# Altium schematic symbol library LimeMicroAltiumLib_schLib_r05.SchLib: 582 symbols (part 10 of 13) (continued)
## MOLEX_CONNECTOR_0878321420
designator J?, comment 878321420
Male Header, Pitch 2 mm, 2 x 7 Position, Height 7.6 mm, -55 to 105 degC, RoHS; Part Description: Connector Header Surface Mount 14 position 0.079" (2.00mm); Manufacturer: Molex; Manufacturer Part Number 1: 87832-1420; Number of Positions: 14; Current Rating: 2A; Insulation Resistance: 1GR; Voltage Rating: 125V; Shrouded: Yes (With); Pitch: 2mm; Glow Wire Compliant: Non-compliant; Supplier 1: Digi-Key; Stock 1: 62479; Pricing 1: 1 = 1,83000, 10 = 1,66000, 100 = 1,42280, 500 = 1,18562, 3200 = 0,94850, 6400 = 0,90108 (USD); RoHS: Yes; Mount: Surface Mount; Color: Black; Housing Color: Black; Housing Material: Thermoplastic; Contact Plating: Gold; Contact Material: Brass; Min Operating Temperature: -55°C; Max Operating Temperature: 105°C; Number of Rows: 2; Packaging: Rail/Tube; Termination: SMD/SMT; Number of Contacts: 14; Orientation: Vertical; Gender: Male; Package Quantity: 3200; Number of Circuits: 14; Voltage Rating (DC): 125V; Radiation Hardening: No; REACH SVHC: No SVHC; Lead Free: Lead Free; Flammability Rating: UL94 V-0; ComponentLink1URL: https://datasheet.ciiva.com/5151/0878321420-pcb-headers-176595-5151942.pdf?src-supplier=Mouser; ComponentLink1Description: https://datasheet.ciiva.com/5151/0878321420-pcb-headers-176595-5151942.pdf?src-supplier=Mouser; ComponentLink2URL: https://datasheet.ciiva.com/30118/0878321420-pcb-headers-30118102.pdf?src-supplier=Onlinecomponents.com; ComponentLink2Description: https://datasheet.ciiva.com/30118/0878321420-pcb-headers-30118102.pdf?src-supplier=Onlinecomponents.com; ComponentLink3URL: https://datasheet.ciiva.com/11746/0900766b80d68d6a-11746394.pdf?src-supplier=RSComponents; ComponentLink3Description: https://datasheet.ciiva.com/11746/0900766b80d68d6a-11746394.pdf?src-supplier=RSComponents; ComponentLink4URL: https://datasheet.ciiva.com/7814/1625645-7814923.pdf?src-supplier=Element14; ComponentLink4Description: https://datasheet.ciiva.com/7814/1625645-7814923.pdf?src-supplier=Element14; ComponentLink5URL: https://datasheet.ciiva.com/27055/1934622-27055085.pdf?src-supplier=Jameco; ComponentLink5Description: https://datasheet.ciiva.com/27055/1934622-27055085.pdf?src-supplier=Jameco; ComponentLink6URL: https://datasheet.ciiva.com/1103/1739253-1103569.pdf?src-supplier=Element14; ComponentLink6Description: https://datasheet.ciiva.com/1103/1739253-1103569.pdf?src-supplier=Element14; ComponentLink7URL: https://datasheet.ciiva.com/18453/70090647-18453733.pdf?src-supplier=Allied+Electronics; ComponentLink7Description: https://datasheet.ciiva.com/18453/70090647-18453733.pdf?src-supplier=Allied+Electronics; ComponentLink8URL: https://datasheet.ciiva.com/6168/1597333-6168907.pdf?src-supplier=Farnell; ComponentLink8Description: https://datasheet.ciiva.com/6168/1597333-6168907.pdf?src-supplier=Farnell; Supplier Part Number 1: WM18641-ND
footprint MOLX-878321420_V (SMD, 14-Leads, Body 16.65x6.3mm, Pitch 2mm)
pins: 1, 2, 3, 4, 5, 6, 7, 8, 9, 10, 11, 12, 13, 14

## MURA120T3G_diode
designator D?, comment MURA120T3G
Part Description: Diode Standard 200V 2A Surface Mount SMA; Manufacturer: ON Semiconductor; Max Surge Current: 40A; Forward Voltage: 875mV; Forward Current: 2A; Peak Reverse Current: 2uA; Recovery Time: 35ns; Max Repetitive Reverse Voltage (Vrrm): 200V; Element Configuration: Single; Polarity: Standard; Output Current: 1A; ComponentLink1URL: http://www.mouser.com/ds/2/427/mmsz5225-102133.pdf; ComponentLink1Description: http://www.mouser.com/ds/2/427/mmsz5225-102133.pdf; ComponentLink2URL: http://www.onsemi.com/pub/Collateral/MMSD4148T1-D.PDF; ComponentLink2Description: http://www.onsemi.com/pub/Collateral/MMSD4148T1-D.PDF; ComponentLink3URL: http://www.farnell.com/datasheets/1707241.pdf; ComponentLink3Description: http://www.farnell.com/datasheets/1707241.pdf; ComponentLink4URL: https://www.verical.com/server-webapp/html/getDatasheet?partID=78734; ComponentLink4Description: https://www.verical.com/server-webapp/html/getDatasheet?partID=78734; Supplier 1: Digi-Key; Manufacturer Part Number 1: MURA120T3G; RoHS: Yes; Stock 1: 48194; Pricing 1: 1 = 0,39000, 10 = 0,31900, 100 = 0,21720, 500 = 0,16288, 1000 = 0,12217 (USD); Case/Package: SMA; Number of Pins: 2; Contact Plating: Matte,Tin; Min Operating Temperature: -65°C; Max Operating Temperature: 175°C; Package Quantity: 1; Packaging: Tape and Reel; Average Rectified Current: 2A; Reverse Recovery Time: 35ns; Peak Non-Repetitive Surge Current: 40A; Max Forward Surge Current (Ifsm): 40A; Voltage Rating (DC): 200V; Current Rating: 2A; Max Reverse Voltage (DC): 200V; Reverse Voltage: 200V; Length: 4.57mm; Height: 2.05mm; Width: 2.92mm; Radiation Hardening: No; REACH SVHC: No SVHC; Lead Free: Lead Free; Halogen Free: Halogen Free; ComponentLink5URL: http://www.onsemi.com/pub/Collateral/MURA115T3-D.PDF; ComponentLink5Description: http://www.onsemi.com/pub/Collateral/MURA115T3-D.PDF; ComponentLink6URL: http://www.jameco.com/Jameco/Products/ProdDS/1100812.pdf; ComponentLink6Description: http://www.jameco.com/Jameco/Products/ProdDS/1100812.pdf; ComponentLink7URL: http://uk.rs-online.com/webdocs/1221/0900766b812212fb.pdf; ComponentLink7Description: http://uk.rs-online.com/webdocs/1221/0900766b812212fb.pdf; ComponentLink8URL: http://www.farnell.com/datasheets/1750742.pdf; ComponentLink8Description: http://www.farnell.com/datasheets/1750742.pdf; Supplier Part Number 1: MURA120T3GOSCT-ND
footprint MURA120T3G_diode_DO-214AC
pins: A, C

## MUX-74HC4067
designator IC?, comment 74HC4067
MUX-74HC4067; Manufacturer Part Number 1: 74HC4067PW,118; Manufacturer: NXP Semiconductors; Function: Multiplexer/Demultiplexer; On-State Resistance: 120 Ohm; Circuit: 1 x 1:16; Current - Supply: 16µA; Voltage - Supply, Single/Dual (±): 2 V ~ 10 V; Voltage Supply Source: Single Supply; Supplier 1: Digi-Key; Mounting Type: Surface Mount; Supplier Device Package: 24-TSSOP; Packaging: Tape & Reel (TR); RoHS: RoHS Compliant; Operating Temperature: -40°C ~ 125°C; Category: Integrated Circuits (ICs); Package / Case: 24-TSSOP (0.173", 4.40mm Width); Supplier Part Number 1: 74HC4067PW,118-ND
footprint SSOP-24 (SOP, 24-Leads, Body 8,5x5,6mm (max), Pitch 0,65mm, IPC Medium Density)
footprint SSOP-24 (SOP, 24-Leads, Body 8,5x5,6mm (max), Pitch 0,65mm, IPC Medium Density)
pins: 1 COM (io), 2 I7 (io), 3 I6 (io), 4 I5 (io), 5 I4 (io), 6 I3 (io), 7 I2 (io), 8 I1 (io), 9 I0 (io), 10 S0 (in), 11 S1 (in), 12 GND (power), 13 S3 (in), 14 S2 (in), 15 ~{EN} (in), 16 I15 (io), 17 I14 (io), 18 I13 (io), 19 I12 (io), 20 I11 (io), 21 I10 (io), 22 I9 (io), 23 I8 (io), 24 VCC (power)

## MX25U1635EM1I-10G
designator IC?, comment MX25U1635EM1I
Manufacturer: Macronix; Manufacturer Part Number: MX25U1635EM1I-10G; Part Description: FLASH - NOR Memory IC 16Mb (2M x 8) SPI 104MHz 8-SOP; Memory Type: Non-Volatile; Memory Format: FLASH; Memory Size: 16Mb (2M x 8); Write Cycle Time - Word, Page: 30µs, 3ms; Memory Interface: SPI; Voltage - Supply: 1.65 V ~ 2 V; Supplier 1: Digi-Key; RoHS: RoHS Compliant; Category: Integrated Circuits (ICs); Stock 1: 29792; Pricing 1: 1=1.27, 500=0.98924 (USD); Packaging: Tube; Part Status: Not For New Designs; Technology: FLASH - NOR; Operating Temperature: -40°C ~ 85°C (TA); Mounting Type: Surface Mount; Package / Case: 8-SOIC (0.154", 3.90mm Width); Supplier Device Package: 8-SOP; ComponentLink1URL: http://www.macronix.com/Lists/Datasheet/Attachments/6247/MX25U1635E,%201.8V,%2016Mb,%20v2.1.pdf; ComponentLink1Description: http://www.macronix.com/Lists/Datasheet/Attachments/6247/MX25U1635E,%201.8V,%2016Mb,%20v2.1.pdf; Supplier Part Number 1: 1092-1123-ND
footprint MX25U1635EM1I-10G_SOP8_150mil (8-Pin Small Outline Integrated Circuit 1.27 mm Pitch)
pins: 1 CS# (in), 2 SO/SIO1 (io), 3 WP#/SIO2 (io), 4 GND, 5 SI/SIO0 (io), 6 SCLK (in), 7 NC/SIO3 (io), 8 VCC

## N25Q016A11E5140F
designator IC?
Manufacturer: Micron Technology Inc.; Manufacturer Part Number 1: N25Q016A11E5140F TR; Part Description: IC FLASH 16MBIT 108MHZ LBGA; Voltage - Supply: 1.7 V ~ 2 V; Speed: 108MHz; Interface: SPI Serial; Memory Size: 16M (4M x 4); Memory Type: FLASH - NOR; Format - Memory: FLASH; Supplier 1: Digi-Key; Supplier Device Package: 8-XFCSP (2x2.8); RoHS: RoHS Compliant; Packaging: Cut Tape (CT); Package / Case: 8-XFBGA, CSPBGA; Operating Temperature: -40°C ~ 85°C (TA); Category: Integrated Circuits (ICs); Supplier Part Number 1: 557-1634-1-ND
footprint N25Q016A11E5140F (2.8 x 2 16 MB memory)
pins: A1 VCC (power), A2 #S (in), B1 HOLD#/DQ3 (in), B2 DQ1 (io), C1 C (in), C2 W#/VPP/DQ2 (io), D1 DQ0 (io), D2 VSS

## NA6223-AL_Flyback_transformer
designator T?, comment Flyback transformer NA6223-AL
Part Description: Audio Transformers / Signal Transformers NA6223 10W 0.33Ohms For TPS23753A; Manufacturer: Coilcraft; Manufacturer Part Number 1: NA6223-ALD; Current Rating: 2A; Supplier 1: Mouser; RoHS: No; Stock 1: 2080; Pricing 1: 1 = 4,20000, 10 = 3,78000, 50 = 3,36000, 100 = 3,20000, 1000 = 2,49000, 10000 = 2,49000 (USD); REACH SVHC: Unknown; Supplier Part Number 1: 994-NA6223-ALD
footprint PoE13P-50L_Flyback_transformer
pins: 1, 2, 3, 4, 5, 6, 7, 10
text: Pri; W1B; Sync; W5; W1A; Sec; W3; Bias

## NANO_SIM_SIM8060-6-1-14-00-A
designator J?, comment Nano SIM card holder
Part Description: 8 (6 + 2) Position Card Connector NANO SIM Surface Mount, Right Angle Gold; Manufacturer: Global Connector Technology; Manufacturer Part Number 1: SIM8060-6-1-14-00-A; Supplier 1: Newark; Supplier Part Number 1: 94AC8253; Stock 1: 553; Pricing 1: 1=1,22000, 10=1,17000, 25=1,10000, 50=1,05000, 100=0,98900, 250=0,93200, 500=0,87400 (USD); RoHS: No
footprint NANO_SIM_SIM8060-6-1-14-00-A
pins: C1 VCC (power), C2 RST (in), C3 CLK (in), C5 GND (power), C6 VPP, C7 I/O (io), S1 SHIELD_GND (power), S2 SHIELD_GND (power), S3 SHIELD_GND (power), SW CD

## nano_SIM_SIM8066-6-1-14-01-A
designator J?, comment nano SIM (push-push)
Part Description: 7 (6 + 1) Position Card Connector NANO SIM Surface Mount, Right Angle Gold; Manufacturer: Global Connector Technology; Manufacturer Part Number 1: SIM8066-6-1-14-01-A; Supplier 1: Farnell; Supplier Part Number 1: 3772948; Stock 1: 1500; Pricing 1: 1500=1,00000, 7500=0,93000, 15000=0,86600, 30000=0,81900 (EUR); RoHS: No
footprint nano_SIM_SIM8066-6-1-14-01-A
pins: C1 VCC (power), C2 RST (in), C3 CLK (in), C5 GND (power), C6 VPP (power), C7 I/O (io), CD (io), G1 GND (power), G2 GND (power), G3 GND (power), G4 GND (power)

## NB3H83905C
designator IC?
Manufacturer: ON Semiconductor; Manufacturer Part Number 1: NB3H83905CMNG; Part Description: Clock Fanout Buffer (Distribution) IC 100MHz 20-VFQFN Exposed Pad; Output: LVCMOS, LVTTL; Voltage - Supply: 1.6 V ~ 3.465 V; Input: LVCMOS, LVTTL, Crystal; Ratio - Input:Output: 1:6; Number of Circuits: 1; Frequency - Max: 100MHz; Differential - Input:Output: No/No; Supplier 1: Digi-Key; Packaging: Tape & Reel (TR); Operating Temperature: -40°C ~ 85°C; Type: Fanout Buffer (Distribution); Mounting Type: Surface Mount; Category: Integrated Circuits (ICs); RoHS: RoHS Compliant; Package / Case: 20-VFQFN Exposed Pad; Supplier Device Package: 20-QFN (3x4); Supplier Part Number 1: NB3H83905CMNGOS-ND
footprint NB3H83905C_20QFN (QFN, 20-Leads, Body 4,00x4,00mm, Pitch 0,50mm, Thermal Pad 2,70x2,70mm, IPC Medium Density)
pins: 1 GND, 2 GND, 3 BCLK0 (out), 4 VDDO (power), 5 BCLK1 (out), 6 GND, 7 GND, 8 BCLK2 (out), 9 VDD (power), 10 BCLK3 (out), 11 GND, 12 GND, 13 BCLK4 (out), 14 VDDO (power), 15 BCLK5 (out), 16 NC, 17 ENABLE1 (in), 18 XTAL_IN/CLK (in), 19 XTAL_OUT (out), 20 ENABLE2 (in), 21 EP

## NC7SV74K8XCT
designator IC?
Manufacturer: Fairchild Semiconductor; Max Propagation Delay @ V, Max CL: 2.8ns @ 3.3V, 30pF; Frequency - Clock: 200MHz; Current - Output High, Low: 24mA, 24mA; Current - Quiescent: 0.9µA; Number of Bits per Element: 1; Trigger Type: Positive Edge; Output Type: Differential; Function: Set(Preset) and Reset; Input Capacitance: 2pF; Voltage - Supply: 0.9 V ~ 3.6 V; Supplier 1: Digi-Key; Operating Temperature: -40°C ~ 85°C (TA); Mounting Type: Surface Mount; Package / Case: 8-VFSOP (0.091", 2.30mm Width); Packaging: Cut Tape (CT); Number of Elements: 1; Manufacturer Part Number 1: NC7SV74K8X; RoHS: RoHS Compliant; Type: D-Type; Category: Integrated Circuits (ICs); Supplier Part Number 1: NC7SV74K8XCT-ND
footprint NC7SV74K8XCT (SOIC, 8-Leads, Body 2,00x2,30mm, Pitch 1,27mm, IPC Medium Density)
pins: 1 C, 2 D, 3 Qn, 4 GND, 5 Qp, 6 CLR, 7 PR, 8 VCC

## NC7WZ16P6X_DUAL_BUFFER
designator IC?, comment NC7WZ16P6X
Manufacturer: ON Semiconductor / Fairchild; Part Description: Buffer, Non-Inverting 2 Element 1 Bit per Element Push-Pull Output SC-70-6; Min Supply Voltage: 1.65V; Max Supply Voltage: 5.5V; Number of Channels: 2; Propagation Delay: 3.8ns; Logic Function: Buffer,Inverting; Max Power Dissipation: 180mW; Low Level Output Current: 32mA; Polarity: Non-Inverting; Number of Bits per Element: 1; High Level Output Current: -32mA; Turn-On Delay Time: 10.6ns; Quiescent Current: 1uA; Supplier 1: Digi-Key; Manufacturer Part Number 1: NC7WZ16P6X; Stock 1: 0; Mount: Surface Mount; Case/Package: SC; Number of Pins: 6; Weight: 0.028g; Contact Plating: Matte,Tin; Min Operating Temperature: -40°C; Max Operating Temperature: 125°C; Number of Inputs: 2; Number of Outputs: 2; Packaging: Tape and Reel; Package Quantity: 3000; Number of Elements: 2; Number of Input Lines: 2; Number of Output Lines: 2; Termination: SMD/SMT; Number of Circuits: 2; Number of Bits: 2; Length: 2mm; Height: 1mm; Width: 1.25mm; Radiation Hardening: No; REACH SVHC: No SVHC; Lead Free: Lead Free; Supplier Part Number 1: NC7WZ16P6XDKR-ND
footprint SC-70_NC7WZ16P6X (SC-70 (SOT323), 6 pin)
pins: 1 A1 (in), 2 GND, 3 A2 (in), 4 Y2 (out), 5 VCC (power), 6 Y1 (out)

## NCP331SNT1G
designator IC?
Manufacturer: ON Semiconductor; Part Description: IC LOAD SWITCH SOFT START 6TSOP; Switch Type: General Purpose; Number of Outputs: 1; Ratio - Input:Output: 1:1; Output Configuration: High Side; Output Type: N-Channel; Interface: On/Off; Voltage - Load: 1.8 V ~ 5.5 V; Voltage - Supply (Vcc/Vdd): Not Required; Current - Output (Max): 2A; Rds On (Typ): 33 mOhm; Supplier 1: Digi-Key; Manufacturer Part Number: NCP331SNT1G; RoHS: RoHS Compliant; Category: Integrated Circuits (ICs); Stock 1: 3079; Pricing 1: 1=0.73, 10=0.646, 100=0.4951, 500=0.3914, 1000=0.31312 (USD); Packaging: Cut Tape (CT); Part Status: Active; Input Type: -; Features: Load Discharge, Slew Rate Controlled; Fault Protection: -; Operating Temperature: -40°C ~ 85°C (TA); Package / Case: SOT-23-6 Thin, TSOT-23-6; Supplier Device Package: 6-TSOP; ComponentLink1URL: http://www.onsemi.com/pub/Collateral/NCP331-D.PDF; ComponentLink1Description: http://www.onsemi.com/pub/Collateral/NCP331-D.PDF; Supplier Part Number 1: NCP331SNT1GOSCT-ND
footprint NCP331SNT1G_SOT23-6
pins: 1 OUT (out), 2 OUT (out), 3 GND, 4 EN (in), 5 IN (in), 6 IN (in)

## NCP349
designator IC?
Manufacturer: ON Semiconductor; Manufacturer Part Number 1: NCP349MNAETBG; Current - Supply: 70µA; Voltage - Supply: 1.2 V ~ 28 V; Supplier 1: Digi-Key; Operating Temperature: -40°C ~ 85°C; Package / Case: 6-VFDFN Exposed Pad; RoHS: RoHS Compliant; Supplier Device Package: 6-DFN (2x1.6); Category: Integrated Circuits (ICs); Mounting Type: Surface Mount; Voltage - Input: -; Applications: Overvoltage Protection Controller; Packaging: Digi-Reel®; Supplier Part Number 1: NCP349MNAETBGOSDKR-ND
footprint NCP349 (SON, 6-Leads, Body 1,60x2,00mm, Pitch 0,50mm, Thermal Pad 1,20x0,79mm, IPC Medium Density)
pins: 1 IN, 2 GND, 3 FLAG, 4 OUT, 5 OUT, 6 ~{EN}, 7 IN

## NCP361SNT1G
designator IC?
Manufacturer: ON Semiconductor; Part Description: IC USB POS OVP/OCP 5TSOP; Supplier 1: Digi-Key; Manufacturer Part Number 1: NCP361SNT1G; RoHS: RoHS Compliant; Category: Circuit Protection; Stock 1: 11078; Pricing 1: 1=0.76, 10=0.673, 100=0.516, 500=0.40788, 1000=0.3263 (USD); Packaging: Cut Tape (CT); Part Status: Active; Voltage - Clamping: -; Technology: Mixed Technology; Applications: General Purpose; Mounting Type: Surface Mount; Package / Case: SOT-23-5 Thin, TSOT-23-5; Supplier Device Package: 5-TSOP; ComponentLink1URL: http://www.onsemi.com/pub/Collateral/NCP361-D.PDF; ComponentLink1Description: http://www.onsemi.com/pub/Collateral/NCP361-D.PDF; Supplier Part Number 1: NCP361SNT1GOSCT-ND
footprint NCP361SNT1G_TSOP5
pins: 1 IN (in), 2 GND, 3 ~{EN} (in), 4 ~{FLAG} (out), 5 OUT (out)

## NCP380HSN05AAT1G
designator IC?
Manufacturer: ON Semiconductor; Voltage - Input: 2.5 V ~ 5.5 V; Function: Current Limiting; Current - Output: 500mA; Supplier 1: Digi-Key; Category: Integrated Circuits (ICs); Package / Case: 6-TSOP (0.059", 1.50mm Width) 5 leads; Supplier Part Number 1: NCP380HSN05AAT1GOSCT-ND
footprint SOT23-5
pins: 1 OUT, 2 GND, 3 flag, 4 EN, 5 IN

## NCP431AVSNT1GOSCT_VREF
designator D?, comment NCP431AVSNT1G
Part Description: Shunt Voltage Reference IC Adjustable 2.5V 36 VV ±1% 100 mA SOT-23-3 (TO-236); Manufacturer: ON Semiconductor; Max Input Voltage: 2.525V; Max Output Current: 100mA; Output Voltage: 36V; Min Input Voltage: 2.475V; Tolerance: 1%; Min Output Voltage: 2.5V; Temperature Coefficient: 50ppm/°C; Cathode Current: 60uA; Reference Type: Shunt,Adjustable,Programmable; Output Type: Adjustable; Supplier 1: Digi-Key; Supplier Part Number 1: NCP431AVSNT1GOSCT-ND; Manufacturer Part Number 1: NCP431AVSNT1G; Stock 1: 4600; Pricing 1: 1=0,44000, 10=0,35700, 25=0,32640, 100=0,24290, 250=0,22008, 500=0,18216, 1000=0,13661 (USD); RoHS: Yes; Case/Package: SOT-23-3; Number of Pins: 3; Min Operating Temperature: -40°C; Max Operating Temperature: 125°C; Package Quantity: 3000; Packaging: Tape and Reel; Max Output Voltage: 36V; Output Current: 100mA; Reference Voltage: 2.5V; Length: 3.04mm; Width: 1.4mm; Height: 1.01mm; Radiation Hardening: No; REACH SVHC: No SVHC; Lead Free: Lead Free; Halogen Free: Halogen Free; ComponentLink1URL: https://datasheet.ciiva.com/8132/ncp431-d-8132432.pdf?src-supplier=Avnet; ComponentLink1Description: https://datasheet.ciiva.com/8132/ncp431-d-8132432.pdf?src-supplier=Avnet; ComponentLink2URL: https://datasheet.ciiva.com/30476/0900766b8121bbe3-30476322.pdf?src-supplier=RSComponents; ComponentLink2Description: https://datasheet.ciiva.com/30476/0900766b8121bbe3-30476322.pdf?src-supplier=RSComponents; ComponentLink3URL: https://datasheet.ciiva.com/49020/70300496-49020892.pdf?src-supplier=Allied+Electronics; ComponentLink3Description: https://datasheet.ciiva.com/49020/70300496-49020892.pdf?src-supplier=Allied+Electronics
footprint SOT23-6
pins: 1 NC, 2 NC, 3 Cathode, 4 Reference, 5 NC, 6 Anode

## NCP702SN28T1G
designator IC?
Manufacturer: ON Semiconductor; Part Description: Linear Voltage Regulator IC Positive Fixed 1 Output 2.8V 200mA 5-TSOP; Output Configuration: Positive; Output Type: Fixed; Voltage - Input (Max): 5.5V; Voltage - Output (Min/Fixed): 2.8V; Current - Output: 200mA; Control Features: Enable; Protection Features: Over Current, Over Temperature, Soft Start, Under Voltage Lockout (UVLO); Supplier 1: Digi-Key; Manufacturer Part Number 1: NCP702SN28T1G; RoHS: RoHS Compliant; Category: Integrated Circuits (ICs); Stock 1: 5251; Pricing 1: 1=0.8, 10=0.707, 100=0.542, 500=0.42848, 1000=0.34278 (USD); Packaging: Cut Tape (CT); Part Status: Active; Voltage - Output (Max): -; Voltage Dropout (Max): -; PSRR: -; Operating Temperature: -40°C ~ 125°C; Mounting Type: Surface Mount; Package / Case: SOT-23-5 Thin, TSOT-23-5; Supplier Device Package: 5-TSOP; Base Part Number: NCP702; ComponentLink1URL: http://www.onsemi.com/pub/Collateral/NCP702-D.PDF; ComponentLink1Description: http://www.onsemi.com/pub/Collateral/NCP702-D.PDF; Supplier Part Number 1: NCP702SN28T1GOSCT-ND
footprint NCP702SN28T1GOSCT-ND_SOT23-5
pins: 1 IN (in), 2 GND, 3 EN (in), 4 NC, 5 OUT (out)

## NCP1083_PoE_controller
designator IC?, comment NCP1083_PoE
Manufacturer: ON Semiconductor; Manufacturer Part Number 1: NCP1083DER2G; Pert Description: Power Over Ethernet Controller 1 Channel 802.3at (PoE+), 802.3af (PoE) 20-TSSOP-EP; Nominal Supply Current: 1.1A; Frequency: 500kHz; Output Voltage: 9V; Number of Outputs: 1; Max Duty Cycle: 80%; Max Power Dissipation: 40W; Topology: Flyback; Supplier 1: Digi-Key; Supplier Part Number 1: NCP1083DER2GOSCT-ND; Stock 1: 12659; Pricing 1: 1=4,10000, 10=3,68200, 25=3,48120, 100=3,01700, 250=2,86228, 500=2,56832, 1000=2,16605 (USD); RoHS: Yes; Case/Package: TSSOP; Number of Pins: 20; Min Operating Temperature: -40°C; Max Operating Temperature: 85°C; Switching Frequency: 500kHz; Output Current: 1.1A; Package Quantity: 2500; Packaging: Tape and Reel; Number of Channels: 1; Series: -; Supply Current: 1.1A; Radiation Hardening: No; REACH SVHC: No SVHC; Lead Free: Lead Free; Halogen Free: Halogen Free; RoHS Compliant: Yes; ComponentLink1URL: https://datasheet.ciiva.com/9213/ncp1083-d-9213696.pdf?src-supplier=Avnet; ComponentLink1Description: https://datasheet.ciiva.com/9213/ncp1083-d-9213696.pdf?src-supplier=Avnet; ComponentLink2URL: https://datasheet.ciiva.com/1573/1441870-1573173.pdf?src-supplier=Farnell; ComponentLink2Description: https://datasheet.ciiva.com/1573/1441870-1573173.pdf?src-supplier=Farnell; ComponentLink3URL: https://datasheet.ciiva.com/1647/1441870-1647157.pdf?src-supplier=Newark; ComponentLink3Description: https://datasheet.ciiva.com/1647/1441870-1647157.pdf?src-supplier=Newark; ComponentLink4URL: https://datasheet.ciiva.com/1573/1441870-1573174.pdf?src-supplier=Farnell; ComponentLink4Description: https://datasheet.ciiva.com/1573/1441870-1573174.pdf?src-supplier=Farnell; ComponentLink5URL: https://datasheet.ciiva.com/16469/ncp1083-d-16469798.pdf?src-supplier=Future+Electronics; ComponentLink5Description: https://datasheet.ciiva.com/16469/ncp1083-d-16469798.pdf?src-supplier=Future+Electronics; ComponentLink6URL: https://datasheet.ciiva.com/1512/1441870-1512909.pdf?src-supplier=Element14; ComponentLink6Description: https://datasheet.ciiva.com/1512/1441870-1512909.pdf?src-supplier=Element14
footprint NCP1083_PoE_controller_TSSOP20
pins: 1 VPORTP (power), 2 CLASS (in), 3 UVLO (in), 4 INRUSH (in), 5 ILIM1 (in), 6 VPORTN1 (power), 7 RTN (power), 8 VPORTN2 (power), 9 AUX (in), 10 TEST (in), 11 OSC (in), 12 CS (in), 13 NCLASS_AT (out), 14 ARTN (power), 15 GATE (out), 16 VDDH (power), 17 VDDL (power), 18 COMP (io), 19 FB (in), 20 SS (in), PAD EP (power)

## NCP59150
designator IC?
Manufacturer Part Number 1: NCP59151DS50R4G; Manufacturer: ON SEMICONDUCTOR; Input Voltage Min: 2.24; Dropout Voltage Vdo: 300; Output Voltage Nom.: 5; Input Voltage Max: 13.5; Output Current: 1.5; LDO Regulator Case Style: TO-263; Supplier 1: Farnell; Operating Temperature Range: -40°C to +125; Supplier Part Number 1: 2217055
footprint DPAK170P1420X450-6N (D2-PAK, 6-Pads, Body 7,75x8,46mm (max), IPC Medium Density)
pins: 1 EN, 2 IN, 3 GND, 4 OUT, 5 ADJ, DAP

## NCP59151
designator IC?
Manufacturer Part Number 1: NCP59151DS50R4G; Manufacturer: ON Semiconductor; Voltage - Output: 5V; Voltage - Dropout (Typical): 0.3V @ 1.5A; Regulator Topology: Positive Fixed; Voltage - Input: Up to 13.5V; Current - Output: 1.5A; Number of Regulators: 1; Supplier 1: Digi-Key; Mounting Type: Surface Mount; Operating Temperature: -40°C ~ 125°C; Supplier Device Package: D2PAK-5; Package / Case: TO-263-6, D²Pak (5 Leads + Tab), TO-263BA; RoHS: RoHS Compliant; Category: Integrated Circuits (ICs); Packaging: Digi-Reel®; Current - Limit (Min): -; Supplier Part Number 1: NCP59151DS50R4GOSDKR-ND
footprint TO-263-5 (D-PAK/TO-263-5; 5 Leads; Body 14.4 (inc. leads) x 10.4 mm (LxW max))
pins: 1 EN (in), 2 IN (in), 3 GND, 4 OUT (out), 5 ADJUST (in)

## NCV4274
designator IC?, comment NCV4274A
Manufacturer Part Number 1: NCV4274ADT50RKG; Manufacturer: ON Semiconductor; Part Description: Linear Voltage Regulator IC Positive Fixed 1 Output 5V 400mA DPAK-3; Voltage - Output: 5V; Voltage - Dropout (Typical): 0.25V @ 250mA; Current - Output: 400mA; Regulator Topology: Positive Fixed; Voltage - Input: 5.5 V ~ 40 V; Number of Regulators: 1; Supplier 1: Digi-Key; RoHS: RoHS Compliant; Supplier Device Package: DPAK-3; Package / Case: TO-252-3, DPak (2 Leads + Tab), SC-63; Mounting Type: Surface Mount; Category: Integrated Circuits (ICs); Current - Limit (Min): 400mA; Operating Temperature: -40°C ~ 150°C; Packaging: Cut Tape (CT); Supplier Part Number 1: NCV4274ADT50RKGOSCT-ND
footprint D2PAK-3 (D-PAK/TO-263-3; 3 Leads (1 Cropped); Body 14.7 (inc. leads) x 10.2 mm (LxW max))
pins: 1 IN (in), 2 GND, 3 OUT_5V (out), 4 GND

## NDS331N
designator VT?
Gate Charge (Qg) @ Vgs: 5nC @ 4.5V; Power - Max: 460mW; Current - Continuous Drain (Id) @ 25°C: 1.3A (Ta); Input Capacitance (Ciss) @ Vds: 162pF @ 10V; FET Type: MOSFET N-Channel, Metal Oxide; Drain to Source Voltage (Vdss): 20V; FET Feature: Logic Level Gate; Supplier Device Package: 3-SSOT; Category: Discrete Semiconductor Products; Mounting Type: Surface Mount; Package / Case: TO-236-3, SC-59, SOT-23-3; Supplier: Digi-Key; Supplier Part Number 1: NDS331NCT-ND
footprint SOT23-3 (SOT23, 3 pin)
pins: D, G, S

## NEO-M7
designator IC?
GNSS engine for GPS/QZSS, GLONASS; Manufacturer: U-blox; DatasheetVersion: R07 11-Nov-2014; PackageDescription: NEO-7 series 12.2 x 16 x 2.4 mm; ComponentLink1URL: https://www.u-blox.com/en/product/neo-7-series; ComponentLink2Description: Datasheet; ComponentLink1Description: https://www.u-blox.com/en/product/neo-7-series
pins: 1 RESV, 2 D_SEL, 3 TIMEPULSE, 4 EXTINT, 5 USB_DM, 6 USB_DP, 7 VDD_USB, 8 RESET_N, 9 VCC_RF, 10 GND, 11 RF_IN, 12 GND, 13 GND, 14 ANT_ON/RESV, 15 RESV, 16 RESV, 17 RESV, 18 DDC_SDA/SPI_CSN, 19 DDC_SCL/SPI_CLK, 20 UART_TX/SPI_MISO, 21 UART_RX/SPI_MOSI, 22 V_BCKP, 23 VCC, 24 GND

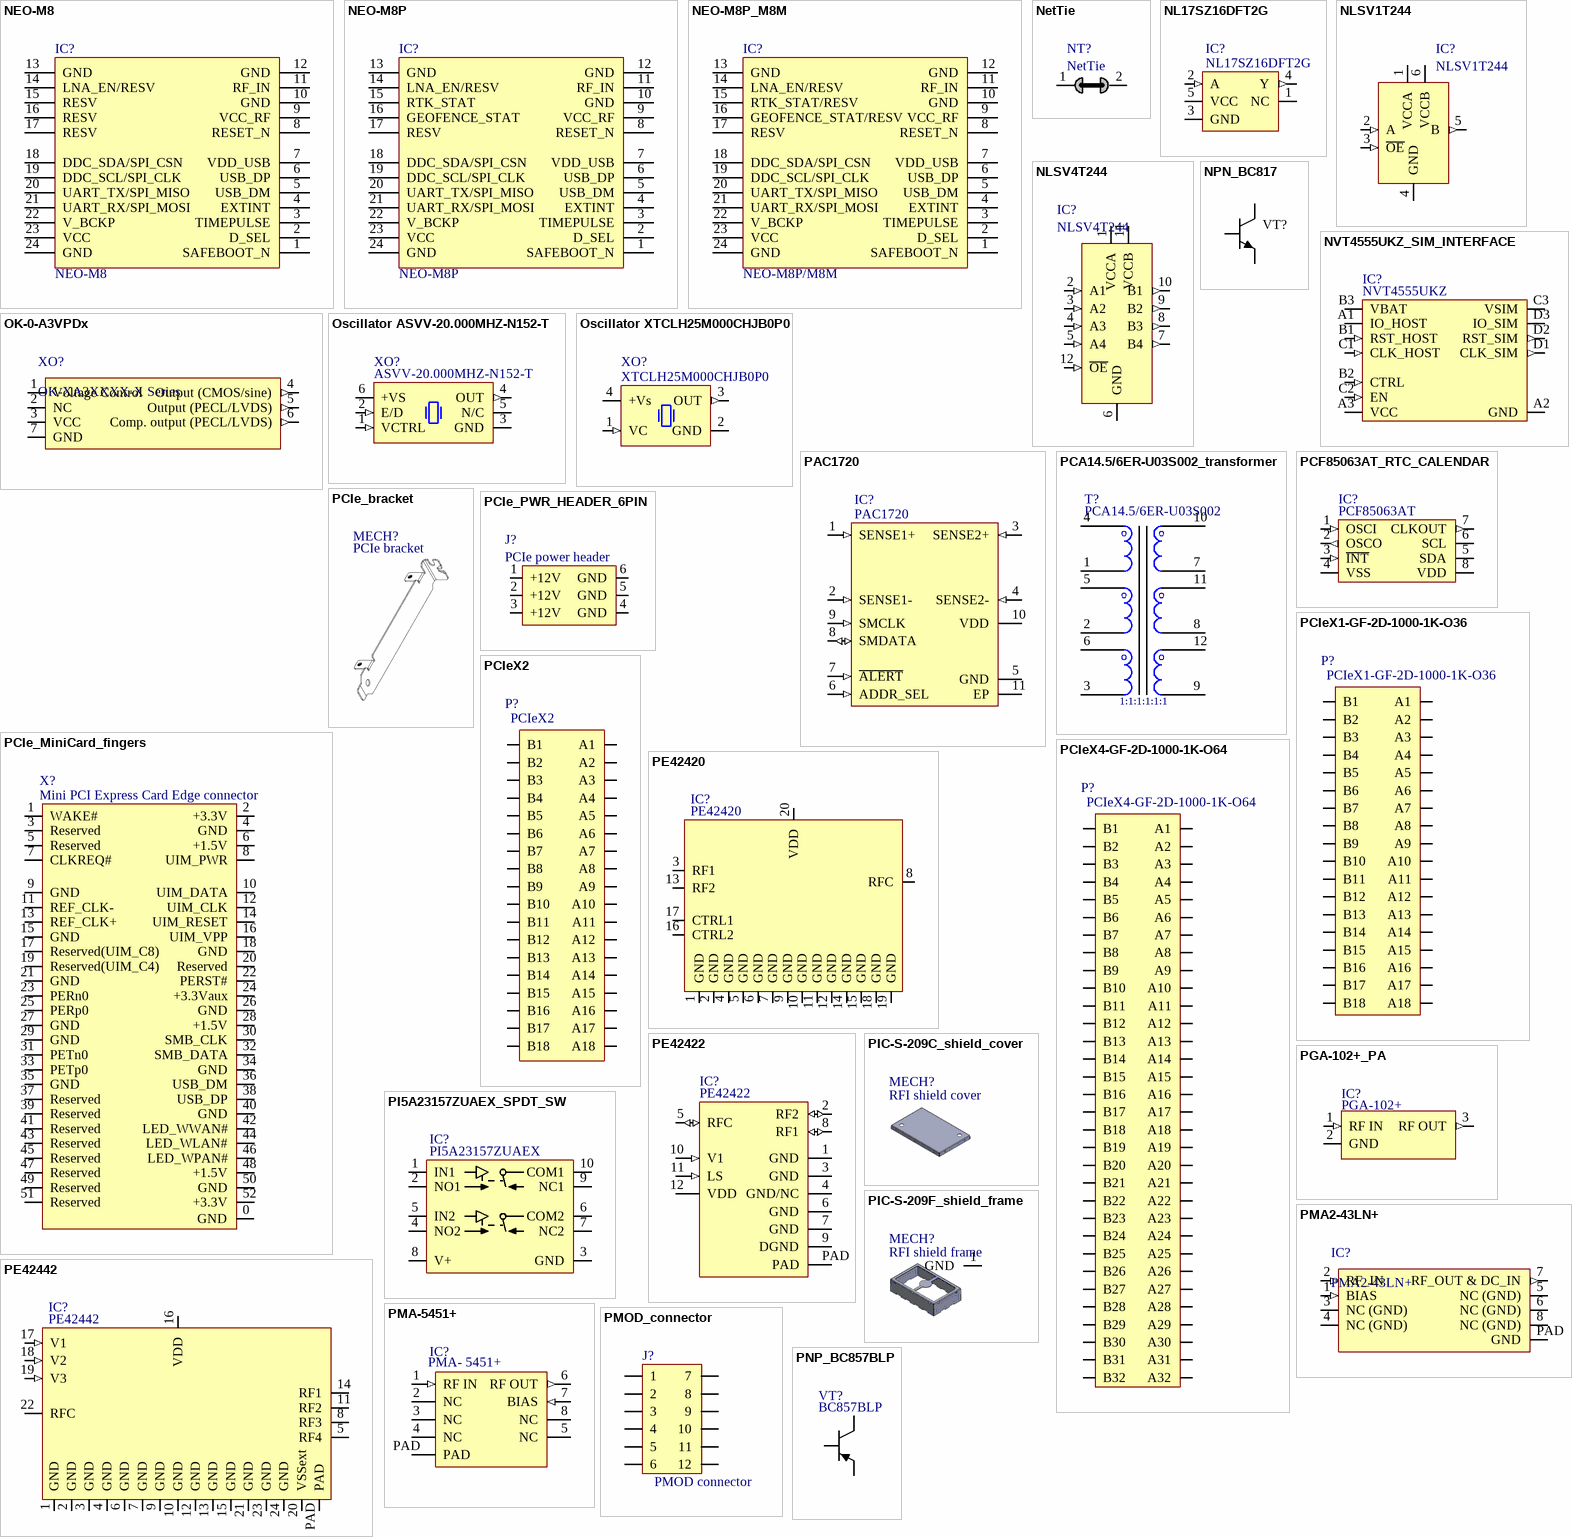
[diagram p60: symbols NEO-M8 to PNP_BC857BLP]

## NEO-M8
designator IC?
GNSS engine for GPS/QZSS, GLONASS; Manufacturer: U-blox; DatasheetVersion: R07 11-Nov-2014; PackageDescription: NEO-7 series 12.2 x 16 x 2.4 mm; ComponentLink1URL: https://www.u-blox.com/en/product/neo-7-series; ComponentLink2Description: Datasheet; ComponentLink1Description: https://www.u-blox.com/en/product/neo-7-series
pins: 1 SAFEBOOT_N, 2 D_SEL, 3 TIMEPULSE, 4 EXTINT, 5 USB_DM, 6 USB_DP, 7 VDD_USB, 8 RESET_N, 9 VCC_RF, 10 GND, 11 RF_IN, 12 GND, 13 GND, 14 LNA_EN/RESV, 15 RESV, 16 RESV, 17 RESV, 18 DDC_SDA/SPI_CSN, 19 DDC_SCL/SPI_CLK, 20 UART_TX/SPI_MISO, 21 UART_RX/SPI_MOSI, 22 V_BCKP, 23 VCC, 24 GND

## NEO-M8P
designator IC?
GNSS engine for GPS/QZSS, GLONASS; Manufacturer: U-blox; DatasheetVersion: R07 11-Nov-2014; PackageDescription: NEO-7 series 12.2 x 16 x 2.4 mm; ComponentLink1URL: https://www.u-blox.com/en/product/neo-7-series; ComponentLink2Description: Datasheet; ComponentLink1Description: https://www.u-blox.com/en/product/neo-7-series
pins: 1 SAFEBOOT_N, 2 D_SEL, 3 TIMEPULSE, 4 EXTINT, 5 USB_DM, 6 USB_DP, 7 VDD_USB, 8 RESET_N, 9 VCC_RF, 10 GND, 11 RF_IN, 12 GND, 13 GND, 14 LNA_EN/RESV, 15 RTK_STAT, 16 GEOFENCE_STAT, 17 RESV, 18 DDC_SDA/SPI_CSN, 19 DDC_SCL/SPI_CLK, 20 UART_TX/SPI_MISO, 21 UART_RX/SPI_MOSI, 22 V_BCKP, 23 VCC, 24 GND

## NEO-M8P_M8M
designator IC?, comment NEO-M8P/M8M
GNSS engine for GPS/QZSS, GLONASS; Manufacturer: U-blox; DatasheetVersion: R07 11-Nov-2014; PackageDescription: NEO-7 series 12.2 x 16 x 2.4 mm; ComponentLink1URL: https://www.u-blox.com/en/product/neo-7-series; ComponentLink2Description: Datasheet; ComponentLink1Description: https://www.u-blox.com/en/product/neo-7-series
pins: 1 SAFEBOOT_N, 2 D_SEL, 3 TIMEPULSE, 4 EXTINT, 5 USB_DM, 6 USB_DP, 7 VDD_USB, 8 RESET_N, 9 VCC_RF, 10 GND, 11 RF_IN, 12 GND, 13 GND, 14 LNA_EN/RESV, 15 RTK_STAT/RESV, 16 GEOFENCE_STAT/RESV, 17 RESV, 18 DDC_SDA/SPI_CSN, 19 DDC_SCL/SPI_CLK, 20 UART_TX/SPI_MISO, 21 UART_RX/SPI_MOSI, 22 V_BCKP, 23 VCC, 24 GND

## NetTie
designator NT?  (net tie, no BOM)
pins: 1, 2

## NL17SZ16DFT2G
designator IC?
Manufacturer: ON Semiconductor; Part Description: Buffer, Non-Inverting 1 Element 1 Bit per Element Push-Pull Output SC-88A (SC-70-5/SOT-353); Logic Type: Buffer, Non-Inverting; Number of Bits per Element: 1; Output Type: Push-Pull; Current - Output High, Low: 32mA, 32mA; Voltage - Supply: 1.65 V ~ 5.5 V; Supplier 1: Digi-Key; Manufacturer Part Number 1: NL17SZ16DFT2G; RoHS: RoHS Compliant; Category: Integrated Circuits (ICs); Stock 1: 2190; Pricing 1: 1=0.34, 10=0.28, 100=0.1485, 500=0.09772, 1000=0.06645 (USD); Packaging: Cut Tape (CT); Part Status: Active; Input Type: -; Operating Temperature: -55°C ~ 125°C (TA); Mounting Type: Surface Mount; Package / Case: 5-TSSOP, SC-70-5, SOT-353; Supplier Device Package: SC-88A (SC-70-5/SOT-353); Base Part Number: 17SZ16; ComponentLink1URL: http://www.onsemi.com/pub/Collateral/NL17SZ16-D.PDF; ComponentLink1Description: http://www.onsemi.com/pub/Collateral/NL17SZ16-D.PDF; Supplier Part Number 1: NL17SZ16DFT2GOSCT-ND
footprint NL17SZ16_SOT23-5
pins: 1 NC, 2 A (in), 3 GND, 4 Y (out), 5 VCC (power)

## NLSV1T244
designator IC?
pins: 1 VCCA (power), 2 A (in), 3 ~{OE} (in), 4 GND (power), 5 B (out), 6 VCCB (power)

## NLSV4T244
designator IC?
Manufacturer: ON Semiconductor; Voltage - Supply: 0.9 V ~ 4.5 V; Logic Function: Translator, Unidirectional, 3-State; Supplier 1: Digi-Key; Category: Integrated Circuits (ICs); Package / Case: 12-UFQFN; Supplier Device Package: 12-UQFN (1.7x2); Supplier Part Number 1: NLSV4T244MUTAGOSDKR-ND
footprint NLSV4T244 (PQFN, 12-Leads, Body 1,70x2,00mm, Pitch 0,40mm, IPC Medium Density)
pins: 1 VCCA (power), 2 A1 (in), 3 A2 (in), 4 A3 (in), 5 A4 (in), 6 GND (power), 7 B4 (out), 8 B3 (out), 9 B2 (out), 10 B1 (out), 11 VCCB (power), 12 ~{OE} (in)

## NPN_BC817
designator VT?  (value not drawn)
Transistor SOT-23; Manufacturer Part Number 1: BC817; Manufacturer: MULTICOMP; Transistor Polarity: NPN; Collector Emitter Voltage V(br)ceo: 45; Transition Frequency ft: 170; Power Dissipation Pd: 300; DC Collector Current: 500; DC Current Gain hFE: 100; No. of Pins: 3; SVHC: No SVHC (16-Jun-2014); DC Current Gain Hfe Max: 600; Supplier 1: Farnell; RoHS: YES; Transistor Case Style: SOT-23; Operating Temperature Max: 150; MSL: -; Operating Temperature Min: -65; Operating Temperature Range: -65°C to +150; Supplier Part Number 1: 1798076
footprint SOT23-3_v2 (SOT23, 3 pin)
pins: 1 B, 2 E, 3 C